# Altium footprint library pw.PcbLib: 210 footprints (part 10 of 14)
Each footprint in its own frame and in the unit in brackets; x right, y up, seen from the top. Pads: shape width x height; smd on the part's side, far side on the other; paste and mask are expansions set on the pad; w line width, h text height; cw(c..) or ccw(c..) is an arc to the next point about the centre after c.
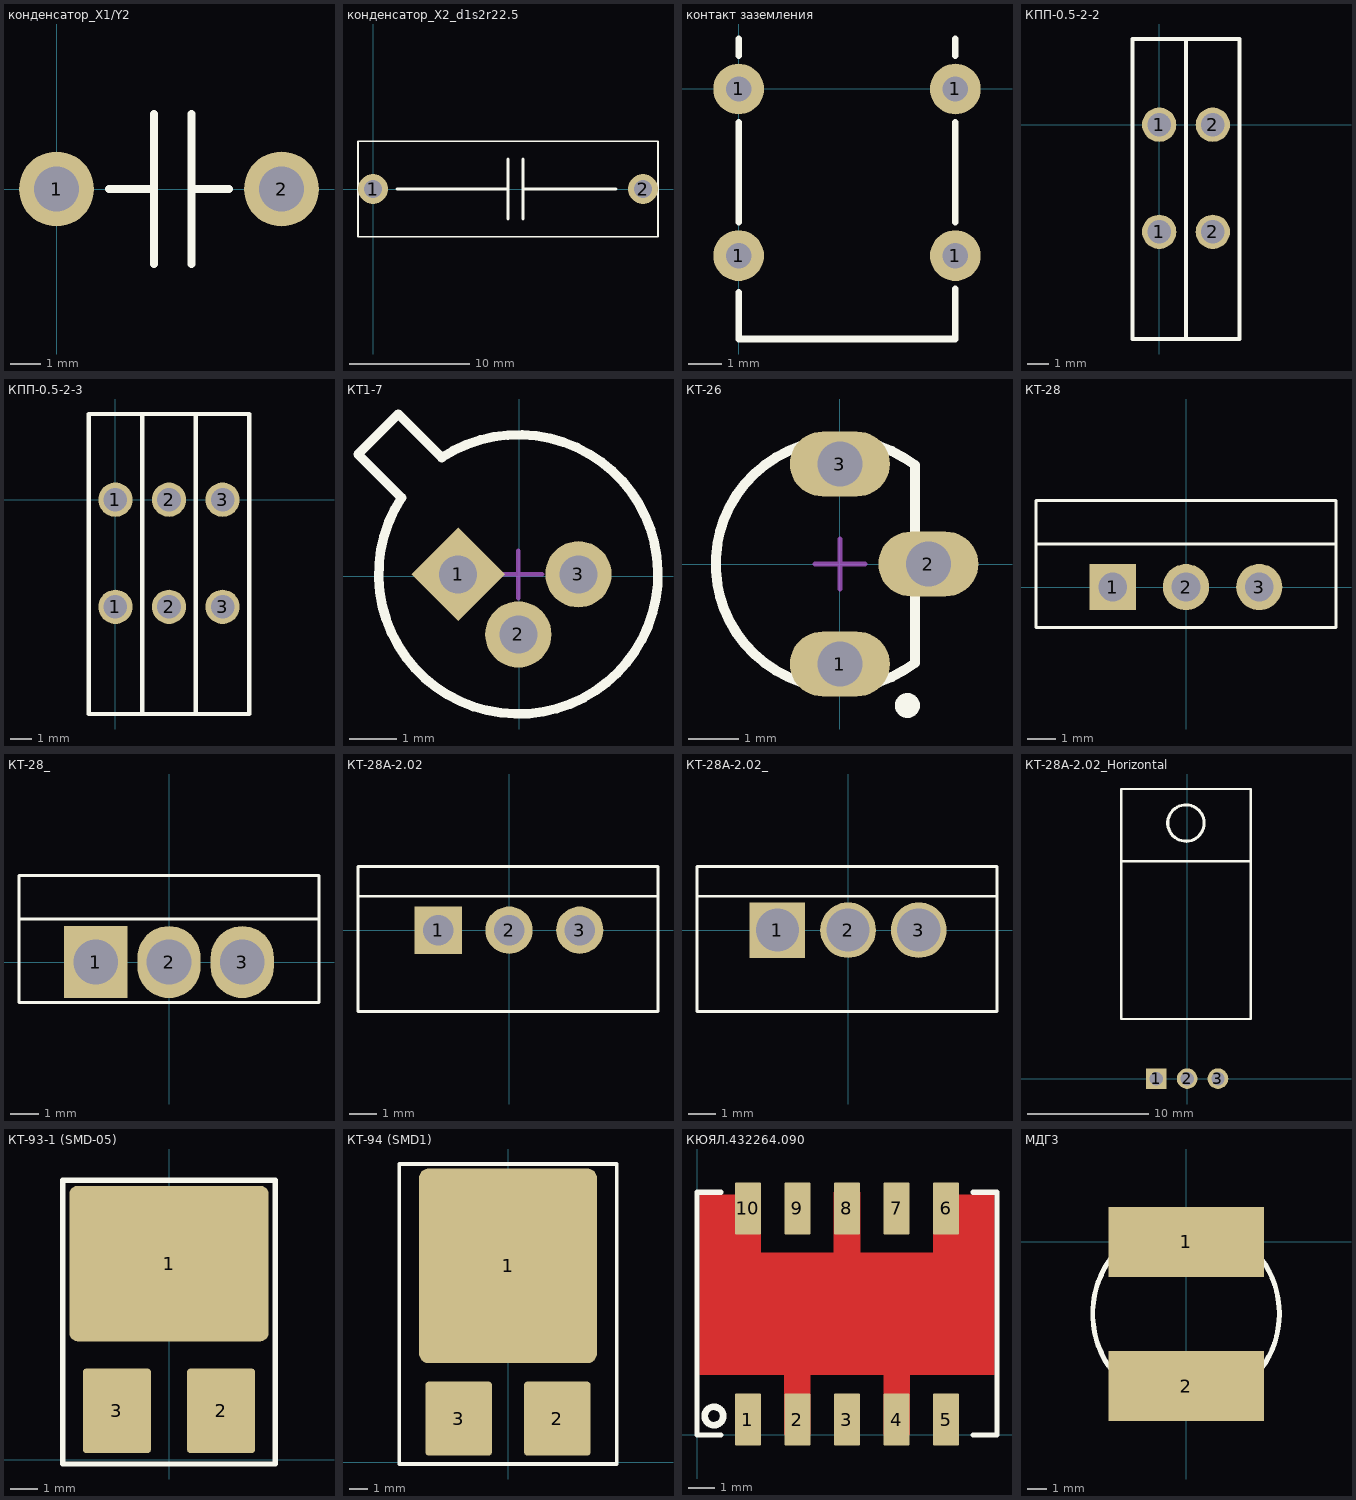
[diagram p9: the footprints below, top view; thin cyan lines are the x and y axes]

## конденсатор_X1/Y2 [mm]
pads (2):
  round 2.5 hole 1.5: 1(0,0) 2(7.5,0)
Top Overlay:
  lines w0.254: 1.75,0 3.25,0 ; 3.25,-2.5 3.25,2.5 ; 4.5,-2.5 4.5,2.5 ; 4.5,0 5.75,0
3D body "User Library-DEBB33A472KA3B.STEP": height 16, standoff -3, extent -2.2,-1.989 9.8,1.99

## конденсатор_X2_d1s2r22.5 [mm]
pads (2):
  round 2.5 hole 1.5: 1(0,0) 2(22.5,0)
Top Overlay:
  lines w0.125: -1.25,-4 23.75,-4 23.75,4 -1.25,4 -1.25,-4
  lines w0.254: 2,0 11.25,0 ; 11.25,-2.5 11.25,2.5 ; 12.5,-2.5 12.5,2.5 ; 12.5,0 20.25,0
3D body "User Library-Hua Jung MKP-185K0305AB1221-P.STEP": height 24, standoff -2.81, extent -1.75,-6.251 24.25,6.251

## контакт заземления [mil]
pads (4):
  round 60 hole 30: 1(0,-196.85) 1(0,0) 1(255.91,-196.85) 1(255.91,0)
Top Overlay:
  lines w7.87: 0,-240.16 0,-295.28 255.91,-295.28 255.91,-236.22 ; 0,-157.48 0,-39.37 ; 0,39.37 0,59.06 ; 255.91,-157.48 255.91,-39.37 ; 255.91,39.37 255.91,59.06

## КПП-0.5-2-2 [mm] "клемма пружинная"
pads (4):
  round 1.6 hole 1.1: 1(0,-5) 1(0,0) 2(2.5,-5) 2(2.5,0)
Top Overlay:
  lines w0.2: 1.25,-10 1.25,4 ; 1.25,-10 3.75,-10 3.75,4 1.25,4 ; 1.25,-10 -1.25,-10 -1.25,4 1.25,4

## КПП-0.5-2-3 [mm]
pads (6):
  round 1.6 hole 1.1: 1(0,-5) 1(0,0) 2(2.5,-5) 2(2.5,0) 3(5,-5) 3(5,0)
Top Overlay:
  lines w0.2: 1.25,-10 1.25,4 ; 1.25,-10 3.75,-10 ; 1.25,-10 -1.25,-10 -1.25,4 1.25,4 ; 1.25,4 3.75,4 ; 3.75,-10 6.25,-10 6.25,4 3.75,4 ; 3.75,-10 3.75,4 ; 3.75,-10 3.75,4

## КТ1-7 [mm]
pads (3):
  rect 1.4x1.4 hole 0.8 rot 45: 1(-1.293,0.043)
  round 1.4 hole 0.8: 2(-0.023,-1.227) 3(1.247,0.043)
Top Overlay:
  lines w0.2: -3.409,2.58 -2.49,1.661 ccw(c-0.023,0.043) -1.641,2.51 -2.56,3.429 -3.409,2.58
Mechanical 15:
  lines w0.1: -0.523,0.043 0.477,0.043 ; -0.023,-0.457 -0.023,0.543
3D body "User Library-TO-18_2N2222.step": height 6.6, standoff -1.79, extent -2.856,-2.732 2.752,2.876

## КТ-26 [mm] "TO, Flat Index; 3 In-Line, Axial Leads; Body Dia. 4.5mm; Leads 0.51 x 0.48 mm (max)"
height 6.86
pads (3):
  oval 2x1.3 hole 0.9: 1(0,-2) 2(1.77,0) 3(0,2)
Top Overlay:
  circle w0.25: c1.35,-2.83 r0.125
  lines w0.2: 1.5,-1.98 cw(c0,0) 1.5,1.98 1.5,-1.98
Mechanical 13:
  lines w0.1: 1.5,-1.98 cw(c0,0) 1.5,1.98 1.5,-1.98
Mechanical 15:
  lines w0.1: -0.5,0 0.5,0 ; 0,-0.5 0,0.5
3D body: height 6.86, standoff 2.2, extent -2.485,-2.495 1.501,2.495

## КТ-28 [mm]
height 4.7
pads (3):
  rect 1.6x1.6 hole 1: 1(-2.54,0)
  round 1.6 hole 1: 2(0,0) 3(2.54,0)
Top Overlay:
  lines w0.1: -5.2,1.5 5.2,1.5 ; -5.2,-1.4 5.2,-1.4 5.2,3 -5.2,3 -5.2,-1.4
3D body "TO-220AC_vert.STEP": height 19.5, standoff -2.5, extent -5.2,-1.4 5.2,3

## КТ-28_ [mm] "Низкая посадка"
height 4.7
pads (3):
  rect 2.2x2.5 hole 1.55: 1(-2.54,0)
  oval 2.2x2.5 hole 1.55: 2(0,0) 3(2.54,0)
Top Overlay:
  lines w0.1: -5.2,1.5 5.2,1.5 ; -5.2,-1.4 -5.2,3 5.2,3 5.2,-1.4 -5.2,-1.4
3D body "TO-220AC_vert_54.stp": height 15, standoff -4, extent -5.204,-1.403 5.196,2.997

## КТ-28А-2.02 [mm]
height 4.7
pads (3):
  rect 1.7x1.7 hole 1.1: 1(-2.54,0)
  round 1.7 hole 1.1: 2(0,0) 3(2.54,0)
Top Overlay:
  lines w0.1: -5.416,1.219 5.346,1.22 ; -5.428,-2.92 5.352,-2.92 5.352,2.283 -5.428,2.283 -5.428,-2.92
3D body "User Library-KT-28A-2_02.step": height 21.5, standoff -10.8, extent -5.438,-2.945 5.362,2.255

## КТ-28А-2.02_ [mm]
height 4.7
pads (3):
  rect 2x2 hole 1.55: 1(-2.54,0)
  round 2 hole 1.55: 2(0,0) 3(2.54,0)
Top Overlay:
  lines w0.1: -5.416,1.219 5.346,1.22 ; -5.428,-2.92 5.352,-2.92 5.352,2.283 -5.428,2.283 -5.428,-2.92
3D body "User Library-KT-28A-2_02.stp": height 13.5, standoff -2.4, extent -5.387,-2.926 5.413,2.274

## КТ-28А-2.02_Horizontal [mm]
height 4.7
pads (3):
  rect 1.7x1.7 hole 1.1: 1(-2.54,0)
  round 1.7 hole 1.1: 2(0,0) 3(2.54,0)
Top Overlay:
  circle w0.254: c-0.101,21.071 r1.5
  lines w0.2: -5.445,4.918 -5.445,23.878 ; -5.441,4.918 5.243,4.917 ; -5.441,17.928 5.243,17.928 5.246,17.93 ; 5.255,4.917 5.255,23.878
  lines w0.203: -5.445,23.878 5.255,23.878
3D body "User Library-KT-28A-2_02-1.step": height 4.15, standoff -5, extent -5.397,-0.432 5.405,23.943

## КТ-93-1 (SMD-05) [mm]
height 3.1
pads (3):
  rrect10% 7.3x5.7 smd: 1(0,7.2)
  rrect10% 2.5x3.1 smd: 2(1.91,1.8) 3(-1.91,1.8)
Top Overlay:
  lines w0.2: -3.9,-0.15 3.9,-0.15 3.9,10.25 -3.9,10.25 -3.9,-0.15
3D body "User Library-KT-93-1.step": height 2.96, standoff -0.04, extent -3.75,0 3.75,10.1

## КТ-94 (SMD1) [mm]
height 3.6
pads (3):
  rrect10% 9.6x10.5 smd: 1(0,10.6)
  rrect10% 3.6x4 smd: 2(2.665,2.35) 3(-2.665,2.35)
Top Overlay:
  lines w0.2: -5.875,-0.1 5.875,-0.1 5.875,16.1 -5.875,16.1 -5.875,-0.1
3D body "КТ-94.STEP": height 3.6, standoff 0, extent -5.79,-0.005 5.79,15.995

## КЮЯЛ.432264.090 [mm]
height 2.5
pads (10):
  rrect10% 1x2 smd: 1(1.95,0.59) 2(3.85,0.59) 3(5.75,0.59) 4(7.65,0.59) 5(9.55,0.59) 6(9.55,8.68) 7(7.65,8.68) 8(5.75,8.68) 9(3.85,8.68) 10(1.95,8.68)
Top Layer:
  rectangle: 0.1,2.3 11.4,7
  region: 6.25,9.3 6.25,6.8 5.25,6.8 5.25,9.3
  region: 3.35,0 3.35,2.5 4.35,2.5 4.35,0
  region: 9.05,6.7 9.05,9.2 11.4,9.2 11.4,6.7
  region: 7.15,0 7.15,2.5 8.15,2.5 8.15,0
  region: 0.1,9.2 0.1,6.95 2.45,6.95 2.45,9.2
Top Overlay:
  circle w0.254: c0.65,0.725 r0.354
  lines w0.2: 0.925,0 0,0 0,9.3 0.925,9.3 ; 10.575,0 11.5,0 11.5,9.3 10.575,9.3
3D body: height 2.07, standoff 0, extent 0,0 11.5,9.3

## МДГ3 [mm]
pads (2):
  rect 8x3.6 smd: 1(0,0) 2(0,-7.43)
Top Overlay:
  circle w0.254: c-0.02,-3.7 r4.8
3D body: height 6.3, standoff 0, extent -4.702,-8.55 4.86,1.031